# Altium footprint library 3D封装库.PcbLib: 716 footprints (part 40 of 45)
Each footprint in its own frame and in the unit in brackets; x right, y up, seen from the top. Pads: shape width x height; smd on the part's side, far side on the other; paste and mask are expansions set on the pad; w line width, h text height; cw(c..) or ccw(c..) is an arc to the next point about the centre after c.
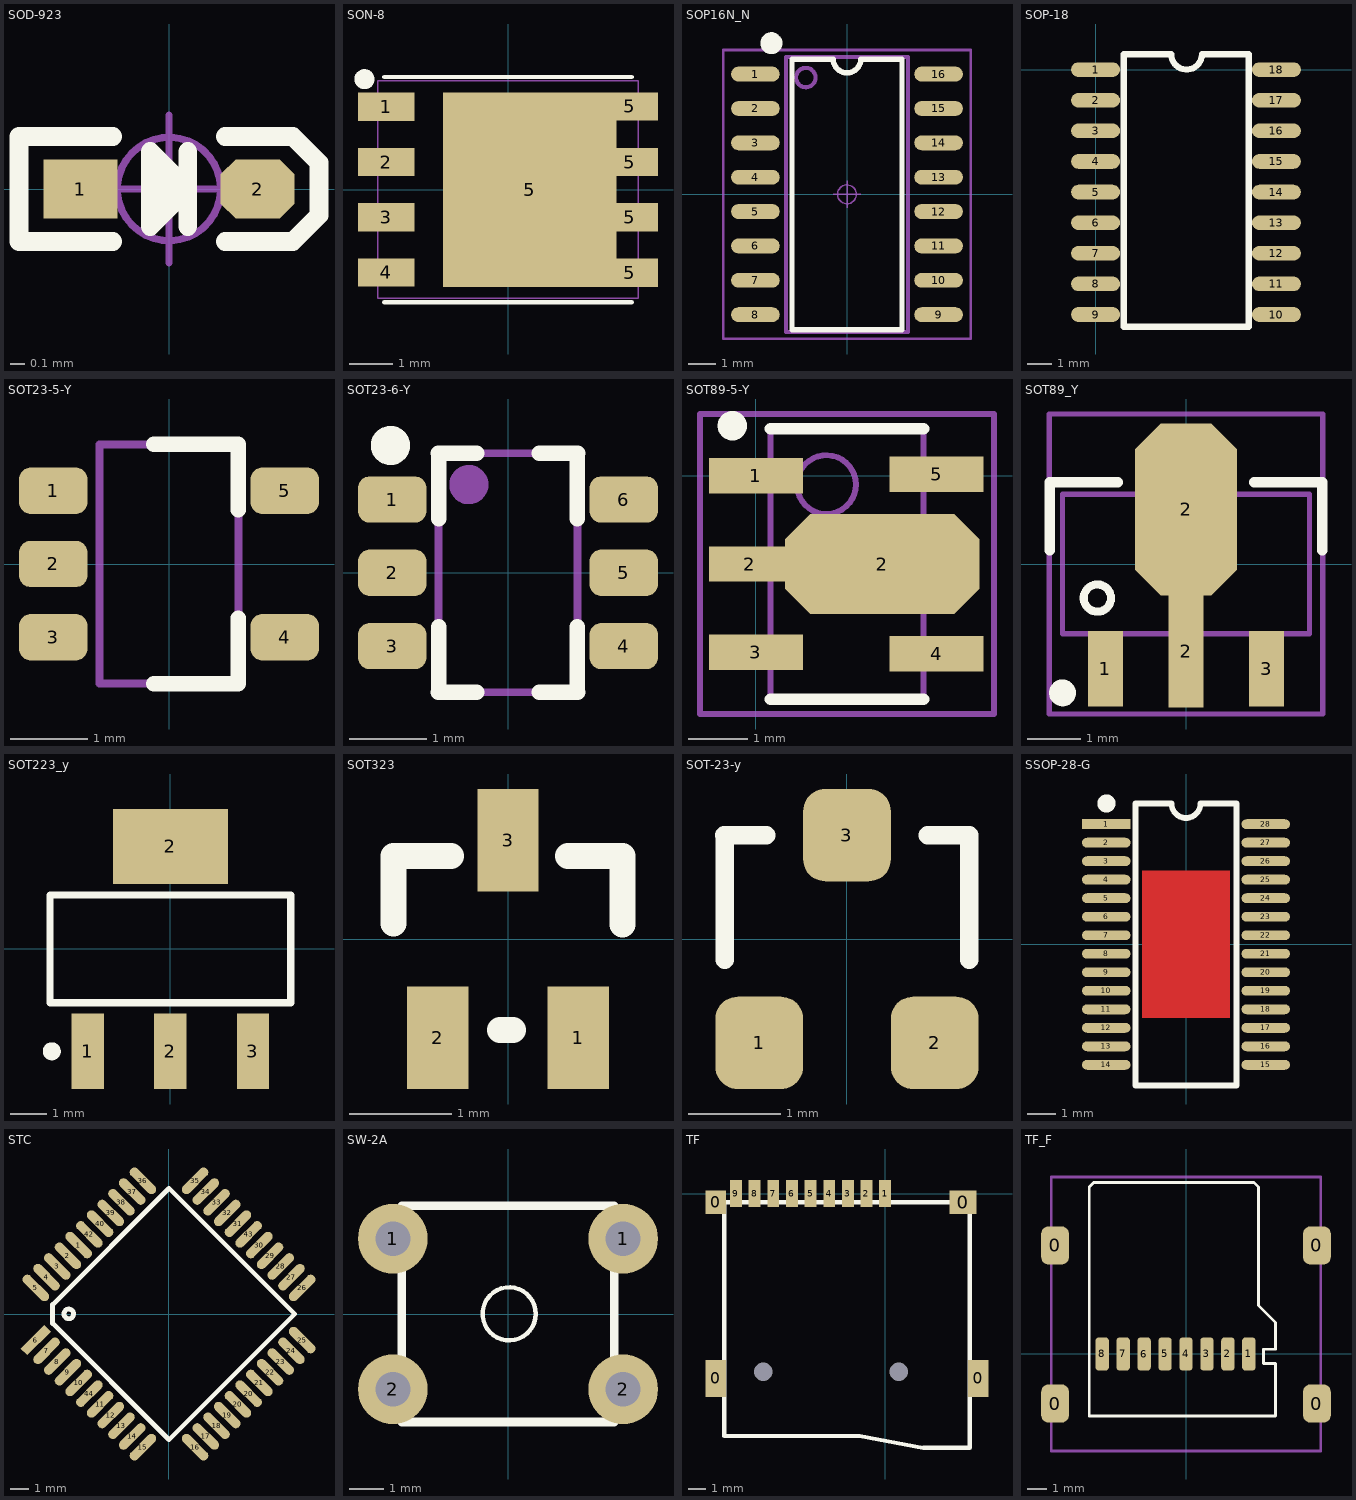
[diagram p39: the footprints below, top view; thin cyan lines are the x and y axes]

## SOD-923 [mm] "0.8x0.6X0.4mm（长宽高，不包括引脚）"
pads (2):
  rect 0.5x0.4 smd: 1(-0.6,0)
  oct 0.5x0.4 smd: 2(0.6,0)
Top Overlay:
  lines w0.127: -0.381,-0.356 -1.016,-0.356 -1.016,0.356 -0.381,0.356 ; 0,-0.127 0,0.127 -0.127,0.254 ; 0.127,-0.254 0.127,0.254 ; 0.381,-0.356 0.838,-0.356 1.016,-0.178 1.016,0.178 0.838,0.356 0.381,0.356 ; -0.127,0.254 -0.127,-0.254 0.127,0 -0.127,0.254
Mechanical 15:
  circle w0.05: c0,0 r0.35
  lines w0.05: -0.5,0 0.5,0 ; 0,-0.5 0,0.5
3D body "SOD-923.STEP": height 0.43, standoff 0.03, extent -0.5,-0.3 0.5,0.3

## SON-8 [mm]
pads (9):
  rect 1.3x0.65 smd mask+0.07: 1(-2.8,1.905) 2(-2.8,0.635) 3(-2.8,-0.635) 4(-2.8,-1.905) 5(2.8,-1.912) 5(2.8,0.635) 5(2.8,1.912)
  rect 4x4.475 smd mask+0.07: 5(0.5,0)
  rect 1.3x0.65 smd: 5(2.8,-0.635)
Top Overlay:
  circle w0.3: c-3.302,2.54 r0.08
  lines w0.1: -2.85,-2.591 2.85,-2.591 ; -2.85,2.591 2.85,2.591
Mechanical 15:
  lines w0.03: -3,-2.5 3,-2.5 3,2.5 -3,2.5 -3,-2.5
3D body "0_4572-1_016.stp": height 0.02, standoff 0, extent 2.184,1.677 3.2,2.134
3D body "0_4572-1_016.stp": height 0.02, standoff 0, extent 2.184,-0.863 3.2,-0.406
3D body "0_4572-1_016.stp": height 0.02, standoff 0, extent 2.184,0.406 3.2,0.864
3D body "0_4572-1_016.stp": height 0.02, standoff 0, extent 2.184,-2.134 3.2,-1.676
3D body "0_4572-1_016.stp": height 0.02, standoff 0, extent -3.2,0.406 -2.184,0.864
3D body "0_4572-1_016.stp": height 0.02, standoff 0, extent -3.2,1.676 -2.184,2.134
3D body "0_4572-1_016.stp": height 0.02, standoff 0, extent -3.2,-0.864 -2.184,-0.406
3D body "0_4572-1_016.stp": height 0.02, standoff 0, extent -3.2,-2.134 -2.184,-1.676
3D body "sst25vf080.stp": height 0.81, standoff 0, extent -3.026,-2.5 3.025,2.5

## SOP16N_N [mm] "10.3*7*1.8mm（长宽高）"
height 1.75
pads (16):
  oval 1.8x0.55 smd: 1(-3.385,4.445) 2(-3.385,3.175) 3(-3.385,1.905) 4(-3.385,0.635) 5(-3.385,-0.635) 6(-3.385,-1.905) 7(-3.385,-3.175) 8(-3.385,-4.445) 9(3.385,-4.445) 10(3.385,-3.175) 11(3.385,-1.905) 12(3.385,-0.635) 13(3.385,0.635) 14(3.385,1.905) 15(3.385,3.175) 16(3.385,4.445)
Top Overlay:
  circle w0.5: c-2.794,5.588 r0.155
  lines w0.2: -2.032,5 -2.032,-5 2.032,-5 2.032,5
  lines w0.203: -2.032,5 -0.508,5 ccw(c0,5) 0,4.492 ccw(c0,5) 0.508,5 2.032,5
Mechanical 13:
  circle w0.15: c-1.524,4.318 r0.359
  lines w0.15: -2.25,-5.08 -2.25,5.08 2.25,5.08 2.25,-5.08 -2.25,-5.08
Mechanical 15:
  circle w0.05: c0,0 r0.35
  lines w0.05: -0.5,0 0.5,0 ; 0,-0.5 0,0.5
  lines w0.1: -4.572,-5.334 -4.572,5.334 4.572,5.334 4.572,-5.334 -4.572,-5.334
3D body "SOP16N.STEP": height 1.9, standoff 0, extent -3.503,-5.25 3.503,5.25

## SOP-18 [mil]
pads (18):
  oval 80x24 smd: 1(0,0) 2(0,-50) 3(0,-100) 4(0,-150) 5(0,-200) 6(0,-250) 7(0,-300) 8(0,-350) 9(0,-400) 10(295.59,-400) 11(295.59,-350) 12(295.59,-300) 13(295.59,-250) 14(295.59,-200) 15(295.59,-150) 16(295.59,-100) 17(295.59,-50) 18(295.59,0)
Top Overlay:
  lines w10: 46.22,-420 250.35,-420 250.35,25 173.78,25 cw(c148.78,25) 123.78,25 46.22,25 46.22,-420

## SOT23-5-Y [mm] "SOT23, 3-Leads, Body 3.1x3.0mm (max), Pitch 0.95mm, IPC Medium Density"
height 1.2
pads (5):
  rrect50% 0.889x0.6 smd: 1(-1.5,0.95) 2(-1.5,0) 3(-1.5,-0.95) 4(1.5,-0.95) 5(1.5,0.95)
Top Overlay:
  lines w0.2: -0.2,-1.55 0.9,-1.55 0.9,-0.7 ; -0.2,1.55 0.9,1.55 0.9,0.7
Mechanical 13:
  lines w0.1: -0.9,-1.55 0.9,-1.55 0.9,1.55 -0.9,1.55 -0.9,-1.55
3D body "SOT23-5.STEP": height 1.15, standoff -0.03, extent -1.403,-1.5 1.403,1.5

## SOT23-6-Y [mm] "SOT23, 3-Leads, Body 3.1x3.0mm (max), Pitch 0.95mm, IPC Medium Density"
height 1.2
pads (6):
  rrect50% 0.889x0.6 smd: 1(-1.5,0.95) 2(-1.5,0) 3(-1.5,-0.95) 4(1.5,-0.95) 5(1.5,0) 6(1.5,0.95)
Top Overlay:
  circle w0.254: c-1.524,1.651 r0.127
  lines w0.2: -0.9,-1.55 -0.9,-0.7 ; -0.9,0.7 -0.9,1.55 ; 0.9,-1.55 0.9,-0.7 ; 0.9,0.7 0.9,1.55
  lines w0.203: -0.9,-1.55 -0.407,-1.55 ; -0.9,1.55 -0.407,1.55 ; 0.407,-1.55 0.9,-1.55 ; 0.407,1.55 0.9,1.55
Mechanical 13:
  circle w0.254: c-0.508,1.143 r0.127
  lines w0.1: -0.9,-1.55 -0.9,1.55 0.9,1.55 0.9,-1.55 -0.9,-1.55
3D body "SOT23-6.STEP": height 1.15, standoff -0.03, extent -1.403,-1.5 1.403,1.5

## SOT89-5-Y [mm] "SOT89, 3-Leads, Body 4.5x2.4mm (max), Pitch 1.50mm, Lead Span 3.5mm, IPC Medium Density"
height 1.6
pads (6):
  rect 1.6x0.6 smd: 1(0,0) 3(0,-3) 4(3.074,-3.024) 5(3.074,0.024)
  rect 1.4x0.6 smd: 2(-0.1,-1.5)
  oct 3.3x1.7 smd: 2(2.15,-1.5)
Top Overlay:
  circle w0.25: c-0.4,0.85 r0.125
  lines w0.2: 0.25,-3.8 2.85,-3.8 ; 0.25,0.8 2.85,0.8
Mechanical 13:
  circle w0.1: c1.2,-0.15 r0.5
  lines w0.1: 0.25,-3.8 2.85,-3.8 2.85,0.8 0.25,0.8 0.25,-3.8
Mechanical 15:
  lines w0.1: 1.05,-1.5 2.05,-1.5 ; 1.55,-2 1.55,-1 ; -0.95,-4.05 4.05,-4.05 4.05,1.05 -0.95,1.05 -0.95,-4.05
3D body: height 0.4, standoff 0, extent -0.736,-3.38 0.255,-2.618
3D body: height 0.4, standoff 0, extent -0.736,-1.881 0.255,-1.119
3D body: height 0.4, standoff 0, extent -0.736,-0.382 0.255,0.38
3D body: height 0.4, standoff 0, extent 2.845,-3.405 3.836,-2.643
3D body: height 0.4, standoff 0, extent 2.845,-2.44 3.709,-0.56
3D body: height 0.4, standoff 0, extent 2.845,-0.357 3.836,0.405
3D body: height 1.6, standoff 0, extent 0.25,-3.8 2.85,0.8

## SOT89_Y [mm] "4.6x4.3x1.6mm(长宽高)"
height 1.6
pads (4):
  rect 0.65x1.4 smd: 1(-1.5,-1.952) 3(1.5,-1.952)
  rect 0.65x2.1 smd: 2(0,-1.626)
  oct 1.9x3.2 smd: 2(0,1.016)
Top Overlay:
  circle w0.25: c-2.3,-2.4 r0.125
  circle w0.15: c-1.651,-0.635 r0.254
  lines w0.2: -2.54,0.254 -2.54,1.524 -1.27,1.524 ; 1.27,1.524 2.54,1.524 2.54,0.254
Mechanical 13:
  circle w0.1: c-1.651,-0.635 r0.25
  lines w0.1: -2.3,-1.3 2.3,-1.3 2.3,1.3 -2.3,1.3 -2.3,-1.3
Mechanical 15:
  circle w0.05: c0,0 r0.35
  lines w0.05: -0.5,0 0.5,0 ; 0,-0.5 0,0.5
  lines w0.1: -2.55,-2.794 -2.55,2.794 2.55,2.794 2.55,-2.794 -2.55,-2.794
3D body "SOT89.STEP": height 1.6, standoff 0.04, extent -2.3,-2.4 2.3,1.9

## SOT223_y [mm] "SOT223, 4-Leads, Body 6.5x3.5mm, Pitch 2.3mm, Lead Span 7mm, IPC High Density"
height 1.7
pads (4):
  rect 0.9x2.1 smd: 1(-2.3,-2.85) 2(0,-2.85) 3(2.3,-2.85)
  rect 3.2x2.1 smd: 2(0,2.85)
Top Overlay:
  circle w0.25: c-3.3,-2.85 r0.125
  lines w0.2: -3.35,-1.5 3.35,-1.5 3.35,1.5 -3.35,1.5 -3.35,-1.5
3D body "sot-233_to261aa.stp": height 1.8, standoff 0, extent -3.25,-3.5 3.25,3.5

## SOT323 [mm]
pads (3):
  rect 0.6x1 smd: 1(0.686,-0.965) 2(-0.686,-0.965) 3(0,0.965)
Top Overlay:
  lines w0.254: -1.118,0.152 -1.118,0.813 -0.559,0.813 ; -0.076,-0.889 0.051,-0.889 ; 0.584,0.813 1.118,0.813 1.118,0.143
3D body "SOT323 (SC70-3)-1.STEP": height 1.1, standoff 0, extent -1.092,-1.097 1.108,1.148

## SOT-23-y [mm] "Surface mount NPN transistor, package SOT-23"
height 1.1
pads (3):
  rrect50% 0.95x1 smd: 1(-0.95,-1.125) 2(0.95,-1.125) 3(0,1.125)
Top Overlay:
  lines w0.2: -1.328,1.125 -0.875,1.125 ; -1.325,-0.225 -1.325,1.125 ; 0.875,1.125 1.325,1.125 1.325,-0.225
3D body "User Library-SOT23-3.step": height 1.3, standoff 0, extent -1.448,-1.397 1.452,1.403

## SSOP-28-G [mm]
pads (28):
  rect 1.7x0.35 smd: 1(-2.8,4.225)
  oval 1.7x0.35 smd: 2(-2.8,3.575) 3(-2.8,2.925) 4(-2.8,2.275) 5(-2.8,1.625) 6(-2.8,0.975) 7(-2.8,0.325) 8(-2.8,-0.325) 9(-2.8,-0.975) 10(-2.8,-1.625) 11(-2.8,-2.275) 12(-2.8,-2.925) 13(-2.8,-3.575) 14(-2.8,-4.225) 15(2.8,-4.225) 16(2.8,-3.575) 17(2.8,-2.925) 18(2.8,-2.275) 19(2.8,-1.625) 20(2.8,-0.975) 21(2.8,-0.325) 22(2.8,0.325) 23(2.8,0.975) 24(2.8,1.625) 25(2.8,2.275) 26(2.8,2.925) 27(2.8,3.575) 28(2.8,4.225)
Top Layer:
  rectangle: -1.55,-2.59 1.55,2.59
Top Overlay:
  circle w0.381: c-2.794,4.953 r0.127
  lines w0.203: -1.778,-4.953 1.778,-4.953 1.778,4.953 0.508,4.953 cw(c0,4.953) -0.508,4.953 -1.778,4.953 -1.778,-4.953
Top Paste:
  rectangle: 0.624,-2.08 1.248,-1.04
  rectangle: 0.624,-0.52 1.248,0.52
  rectangle: 0.624,1.04 1.248,2.08
  rectangle: -0.312,-2.08 0.312,-1.04
  rectangle: -0.312,-0.52 0.312,0.52
  rectangle: -0.312,1.04 0.312,2.08
  rectangle: -1.248,1.04 -0.624,2.08
  rectangle: -1.248,-0.52 -0.624,0.52
  rectangle: -1.248,-2.08 -0.624,-1.04
Top Solder:
  rectangle: -1.56,-2.6 1.56,2.6
3D body "PWP0028C.stp": height 1.13, standoff 0, extent -3.2,-4.85 3.2,4.85

## STC [mil]
pads (44):
  oval 70x19.68 smd rot 135: 1(-187.91,143.66) 2(-210.18,121.39) 3(-232.45,99.11) 4(-254.72,76.84) 5(-276.99,54.57) 16(54.29,-276.71) 17(76.56,-254.44) 18(98.83,-232.17) 19(121.1,-209.9) 20(143.37,-187.63) 20(165.64,-165.36) 21(187.92,-143.08) 22(210.19,-120.81) 23(232.46,-98.54) 24(254.73,-76.27) 25(277,-54) 36(-54.28,277.28) 37(-76.55,255.01) 38(-98.82,232.74) 39(-121.1,210.47) 40(-143.37,188.2) 42(-165.64,165.93)
  rect 70x19.68 smd rot 45: 6(-276.99,-54)
  oval 70x19.68 smd rot 45: 7(-254.72,-76.27) 8(-232.45,-98.54) 9(-210.18,-120.81) 10(-187.91,-143.08) 11(-143.37,-187.63) 12(-121.1,-209.9) 13(-98.82,-232.17) 14(-76.55,-254.44) 15(-54.28,-276.71) 26(277,54.57) 27(254.73,76.84) 28(232.46,99.11) 29(210.19,121.39) 30(187.92,143.66) 31(143.37,188.2) 32(121.1,210.47) 33(98.83,232.74) 34(76.56,255.01) 35(54.29,277.28) 43(165.64,165.93) 44(-165.64,-165.36)
Top Overlay:
  circle w10: c-208.44,0.41 r10.05
  lines w9.84: 0,-261.4 261.69,0.29 0,261.97
  lines w10: 0,-261.4 -242.19,-19.2 -242.19,19.77 0,261.97

## SW-2A [mm]
pads (4):
  round 2 hole 1: 1(-3.302,2.159) 1(3.302,2.159) 2(-3.302,-2.159) 2(3.302,-2.159)
Top Overlay:
  circle w0.127: c0.034,0.004 r0.762
  lines w0.254: -3.048,-3.095 -3.048,3.103 3.048,3.103 3.048,-3.095 -3.048,-3.095
3D body "4pin_TS-1143-WP.STEP": height 4.3, standoff -3.5, extent -4.125,-3.27 4.143,3.23

## TF [mm]
pads (15):
  rect 1.2x2.2 smd: 0(-10,-10.9) 0(5.5,-10.9)
  rect 1.2x1.4 smd: 0(-10,-0.5)
  rect 0x0 hole 1.1: 0(-7.2,-10.5) 0(0.8,-10.5)
  rect 1.6x1.4 smd: 0(4.6,-0.5)
  rect 0.7x1.6 smd: 1(0,0) 2(-1.1,0) 3(-2.2,0) 4(-3.3,0) 5(-4.4,0) 6(-5.5,0) 7(-6.6,0) 8(-7.7,0) 9(-8.8,0)
Top Overlay:
  lines w0.254: -9.5,-14.3 -1.5,-14.3 2.25,-15 5,-15 5,-0.5 -9.5,-0.5 -9.5,-14.3
3D body "User Library-112J-TXAR-R_C_1-1.STEP": height 1.9, standoff -0.55, extent -10.3,-14.5 5.8,0.503

## TF_F [mm]
pads (12):
  rrect50% 1.45x2 smd: 0(-6.875,-2.6) 0(-6.875,5.7) 0(6.875,-2.6) 0(6.875,5.7)
  rrect50% 0.7x1.75 smd: 1(3.3,0) 2(2.2,0) 3(1.1,0) 4(0,0) 5(-1.1,0) 6(-2.2,0) 7(-3.3,0) 8(-4.4,0)
Top Overlay:
  lines w0.152: -5.08,-3.25 -5.08,8.763 -4.843,9 3.573,9 3.81,8.763 3.81,2.54 4.699,1.651 4.699,0.25 4.064,0.25 4.064,-0.5 4.699,-0.5 4.699,-3.25 -5.08,-3.25
Mechanical 15:
  lines w0.152: -7.075,-5.1 -7.075,9.3 7.075,9.3 7.075,-5.1 -7.075,-5.1
3D body "693072010801.stp": height 1.77, standoff 0, extent -7.25,-4.2 7.25,9.5